# Altium footprint library capacitor_thd.PcbLib: 131 footprints (part 9 of 9)
Each footprint in its own frame and in the unit in brackets; x right, y up, seen from the top. Pads: shape width x height; smd on the part's side, far side on the other; paste and mask are expansions set on the pad; w line width, h text height; cw(c..) or ccw(c..) is an arc to the next point about the centre after c.
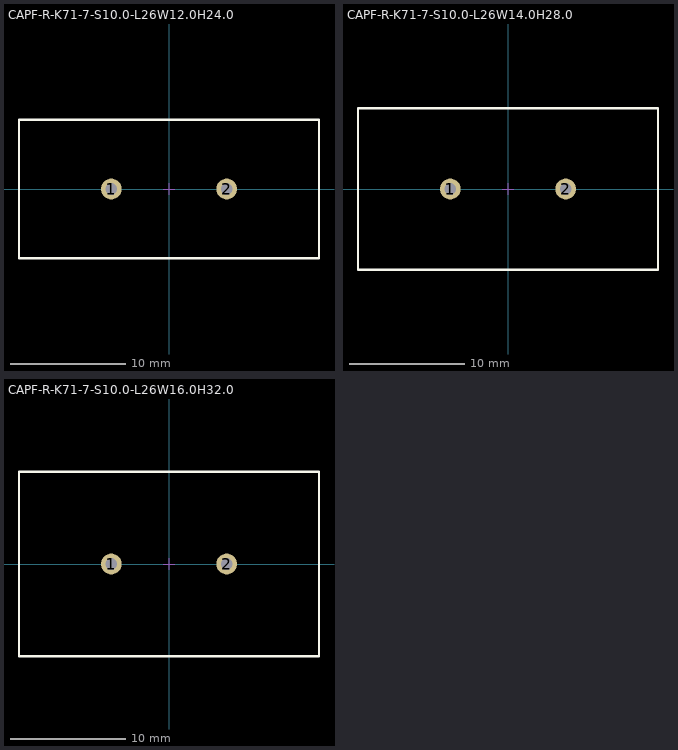
[diagram p8: the footprints below, top view; thin cyan lines are the x and y axes]

## CAPF-R-K71-7-S10.0-L26W12.0H24.0 [mm] "Capacitor K71-7, 0.20 - 0.30uF, Radial, Pin spacing 10.0mm - Length 26.0mm Width 12.0mm Height 24.0mm"
height 24
pads (2):
  round 1.8 hole 1: 1(-5,0) 2(5,0)
Top Overlay:
  lines w0.2: -13,-6 -13,6 -5,6 5,6 13,6 13,-6 5,-6 -5,-6 -13,-6
Mechanical 1:
  lines w0.1: -13,-6 13,-6 13,6 -13,6 -13,-6
Mechanical 15:
  lines w0.1: -0.5,0 0.5,0 ; 0,-0.5 0,0.5 ; -13,-6 -13,6 13,6 13,-6 -13,-6
3D body "CAPF-R-K71-7-S10.0-L26W12.0H24.0.STEP": height 24, standoff -5, extent -13,-6.01 13,6

## CAPF-R-K71-7-S10.0-L26W14.0H28.0 [mm] "Capacitor K71-7, 0.30 - 0.40uF, Radial, Pin spacing 10.0mm - Length 26.0mm Width 14.0mm Height 28.0mm"
height 28
pads (2):
  round 1.8 hole 1: 1(-5,0) 2(5,0)
Top Overlay:
  lines w0.2: -13,-7 -13,7 -5,7 5,7 13,7 13,-7 5,-7 -5,-7 -13,-7
Mechanical 1:
  lines w0.1: -13,-7 13,-7 13,7 -13,7 -13,-7
Mechanical 15:
  lines w0.1: -0.5,0 0.5,0 ; 0,-0.5 0,0.5 ; -13,-7 -13,7 13,7 13,-7 -13,-7
3D body "CAPF-R-K71-7-S10.0-L26W14.0H28.0.STEP": height 28, standoff -5, extent -13,-7.01 13,7

## CAPF-R-K71-7-S10.0-L26W16.0H32.0 [mm] "Capacitor K71-7, 0.40 – 0.5uF, Radial, Pin spacing 10.0mm - Length 26.0mm Width 16.0mm Height 32.0mm"
height 32
pads (2):
  round 1.8 hole 1: 1(-5,0) 2(5,0)
Top Overlay:
  lines w0.2: -13,-8 -5,-8 5,-8 13,-8 13,8 5,8 -5,8 -13,8 -13,-8
Mechanical 1:
  lines w0.1: -13,-8 -13,8 13,8 13,-8 -13,-8
Mechanical 15:
  lines w0.1: -0.5,0 0.5,0 ; 0,-0.5 0,0.5 ; -13,-8 13,-8 13,8 -13,8 -13,-8
3D body "CAPF-R-K71-7-S10.0-L26W16.0H32.0.STEP": height 32, standoff -5, extent -13,-8.01 13,8